# Altium schematic symbol library Schlib.SchLib: 725 symbols (part 2 of 6) (continued)
## BAT54LP-7
designator D?  (value not drawn)
BAT54LP Series 30 V 600 mA Surface Mount Schottky Barrier Diode - DFN1006-2; Manufacturer: Diodes; Manufacturer Part Number: BAT54LP-7; Reverse Voltage: 30V; Supplier: Future Electronics; Supplier Part Number: 2694545; RoHS: Yes; Category: Schottky Diodes; Stock: 663000; Pricing: 3000=0.0541, 9000=0.0521, 15000=0.0512, 45000=0.0492, 75000=0.0476 (USD); ComponentLink1URL: https://datasheet.ciiva.com/16210/ds30504-16210561.pdf?src-supplier=Future+Electronics; ComponentLink1Description: https://datasheet.ciiva.com/16210/ds30504-16210561.pdf?src-supplier=Future+Electronics; ComponentLink2URL: https://datasheet.ciiva.com/4715/ds30504-85267-4715512.pdf?src-supplier=Mouser; ComponentLink2Description: https://datasheet.ciiva.com/4715/ds30504-85267-4715512.pdf?src-supplier=Mouser; ComponentLink3URL: https://datasheet.ciiva.com/15144/getdatasheetpartid-39647-15144085.pdf?src-supplier=Verical; ComponentLink3Description: https://datasheet.ciiva.com/15144/getdatasheetpartid-39647-15144085.pdf?src-supplier=Verical; ComponentLink4URL: https://datasheet.ciiva.com/913/ds30504-913080.pdf?src-supplier=Digikey; ComponentLink4Description: https://datasheet.ciiva.com/913/ds30504-913080.pdf?src-supplier=Digikey; ComponentLink5URL: https://datasheet.ciiva.com/913/ds30504-913081.pdf?src-supplier=Digikey; ComponentLink5Description: https://datasheet.ciiva.com/913/ds30504-913081.pdf?src-supplier=Digikey; ComponentLink6URL: https://datasheet.ciiva.com/913/ds30504-913082.pdf?src-supplier=Digikey; ComponentLink6Description: https://datasheet.ciiva.com/913/ds30504-913082.pdf?src-supplier=Digikey; ComponentLink7URL: https://datasheet.ciiva.com/1180/ds30504-1180298.pdf?src-supplier=Element14; ComponentLink7Description: https://datasheet.ciiva.com/1180/ds30504-1180298.pdf?src-supplier=Element14; ComponentLink8URL: https://datasheet.ciiva.com/8300/ds30504-8300695.pdf?src-supplier=Avnet; ComponentLink8Description: https://datasheet.ciiva.com/8300/ds30504-8300695.pdf?src-supplier=Avnet; ComponentLink9URL: https://datasheet.ciiva.com/8303/ds30504-8303286.pdf?src-supplier=Avnet; ComponentLink9Description: https://datasheet.ciiva.com/8303/ds30504-8303286.pdf?src-supplier=Avnet; ComponentLink10URL: https://datasheet.ciiva.com/22695/1915672-22695255.pdf?src-supplier=Element14; ComponentLink10Description: https://datasheet.ciiva.com/22695/1915672-22695255.pdf?src-supplier=Element14
footprint DFN1006
pins: 1 C, 2 A

## BC807-40W-7
designator Q?  (value not drawn)
BC807 Series PNP 200 mW 45 V 500 mA SMT Small Signal Transistor - SOT-323; Manufacturer: Diodes; Manufacturer Part Number: BC807-40W-7; Collector Emitter Voltage (VCEO): 45V; Max Power Dissipation: 200mW; Number of Elements: 1; Frequency: 100MHz; hFE Min: 250; Max Collector Current: 500mA; Collector Emitter Breakdown Voltage: -45V; Emitter Base Voltage (VEBO): 5V; Collector Emitter Saturation Voltage: -700mV; Element Configuration: Single; Collector-emitter Voltage-Max: 700mV; Supplier: Digi-Key; Supplier Part Number: BC807-40WDICT-ND; RoHS: Yes; Category: BJTs; Stock: 57551; Pricing: 1=0.29000, 10=0.23900, 100=0.12690, 500=0.08348, 1000=0.05676 (USD); Mounting Technology: Surface Mount; Case/Package: SOT-323; Pins: 3; Weight: 0.000212oz; Contact Plating: Tin,Matte; Min Operating Temperature: -65°C; Max Operating Temperature: 150°C; Package Quantity: 3000; Packaging: Tape and Reel; Polarity: PNP; Series: -; Transition Frequency: 100MHz; Max Breakdown Voltage: 45V; Collector Base Voltage (VCBO): 45V; Power Dissipation: 200mW; Gain Bandwidth Product: 100MHz; Clock Frequency: 100MHz; Length: 2.2mm; Width: 1.35mm; Height: 1mm; Radiation Hardening: No; Reach SVHC Compliant: Yes; Lead Free: Lead Free; RoHS Compliant: Yes; ComponentLink1URL: https://datasheet.ciiva.com/11207/ds30577-11207878.pdf?src-supplier=Avnet; ComponentLink1Description: https://datasheet.ciiva.com/11207/ds30577-11207878.pdf?src-supplier=Avnet; ComponentLink2URL: https://datasheet.ciiva.com/4723/ds30577-4723655.pdf?src-supplier=Mouser; ComponentLink2Description: https://datasheet.ciiva.com/4723/ds30577-4723655.pdf?src-supplier=Mouser; ComponentLink3URL: https://datasheet.ciiva.com/11197/ds30577-11197854.pdf?src-supplier=Avnet; ComponentLink3Description: https://datasheet.ciiva.com/11197/ds30577-11197854.pdf?src-supplier=Avnet; ComponentLink4URL: https://datasheet.ciiva.com/1195/ds30577-1195702.pdf?src-supplier=Element14; ComponentLink4Description: https://datasheet.ciiva.com/1195/ds30577-1195702.pdf?src-supplier=Element14
footprint SOT-323, SC-70
pins: 1 B, 2 E, 3 C

## BC817-40WT1G
designator Q?  (value not drawn)
45 V, 0.5 A, General Purpose NPN Transistor SS SC70 GP XSTR NPN 45V; Manufacturer: ON Semiconductor; Manufacturer Part Number: BC817-40WT1G; Max Collector Current: 500mA; Collector Emitter Voltage (VCEO): 700mV; Max Power Dissipation: 460mW; Transition Frequency: 100MHz; Collector Base Voltage (VCBO): 50V; Emitter Base Voltage (VEBO): 5V; Supplier: Digi-Key; Supplier Part Number: BC817-40WT1GOSCT-ND; RoHS: Yes; Category: BJTs; Stock: 106353; Pricing: 1=0.21000, 10=0.17300, 100=0.09180, 500=0.06042, 1000=0.04109 (USD); Mounting Technology: Surface Mount; Contact Plating: Tin; Min Operating Temperature: -55°C; Max Operating Temperature: 150°C; Packaging: Tape and Reel; Collector Emitter Breakdown Voltage: 45V; Lead Free: Lead Free; RoHS Compliant: Yes; ComponentLink1URL: http://www.farnell.com/datasheets/2578322.pdf?src-supplier=Farnell; ComponentLink1Description: http://www.farnell.com/datasheets/2578322.pdf?src-supplier=Farnell; ComponentLink2URL: http://www.onsemi.com/pub/Collateral/BC817-40W-D.PDF?src-supplier=Digi-Key; ComponentLink2Description: http://www.onsemi.com/pub/Collateral/BC817-40W-D.PDF?src-supplier=Digi-Key; ComponentLink3URL: http://www.farnell.com/datasheets/2578322.pdf?src-supplier=Newark; ComponentLink3Description: http://www.farnell.com/datasheets/2578322.pdf?src-supplier=Newark; ComponentLink4URL: http://www.onsemi.com/pub/Collateral/BC817-40W-D.PDF?src-supplier=Avnet; ComponentLink4Description: http://www.onsemi.com/pub/Collateral/BC817-40W-D.PDF?src-supplier=Avnet
footprint SOT-323, SC-70
pins: 1 B, 2 E, 3 C

## BD11600NUX-E2
designator U?  (value not drawn)
DP Type (USB 1ch), VSON010X3020 , RoHS; Manufacturer: Rohm; Manufacturer Part Number: BD11600NUX-E2; Supplier: Rs; Supplier Part Number: 1288866; RoHS: Yes; Category: USB Interface ICs; Stock: 370; Pricing: 10=0.78, 50=0.742, 100=0.592, 500=0.526, 1000=0.511 (GBP); ComponentLink1URL: https://datasheet.ciiva.com/29646/bd11600nux-e-29646416.pdf?src-supplier=Digi-Key; ComponentLink1Description: https://datasheet.ciiva.com/29646/bd11600nux-e-29646416.pdf?src-supplier=Digi-Key
footprint BD11600NUX-E2
pins: 1 1D+, 2 1D-, 3 2D+, 4 2D-, 5 GND, 6 OE, 7 D-, 8 D+, 9 S, 10 VCC, 11 EP

## BLM18AG601SN1D
designator FB?  (value not drawn)
Ferrite Beads Multi-Layer 600Ohm 25% 100MHz 500mA 380mOhm DCR 0603 Automotive Paper T/R; Manufacturer: Murata; Manufacturer Part Number: BLM18AG601SN1D; Material: Steel,Ferrite; Impedance: 600R; Number of Lines: 1; DC Resistance (DCR): 380mR; Shielding: Unshielded; Supplier: Rs; Supplier Part Number: 7241299; RoHS: Yes; Category: Ferrite Beads and Chips; Stock: 6825; Pricing: 25=0.048, 500=0.041, 1000=0.036, 2500=0.032, 5000=0.029 (GBP); Case/Package: 0603; Pins: 2; Core Material: Ferrite; Case Code (Metric): 1608; Case Code (Imperial): 0603; Weight: 7.1E-05oz; Min Operating Temperature: -55°C; Max Operating Temperature: 125°C; Tolerance: 25%; Package Quantity: 1; Max Current Rating: 500mA; Packaging: Tape and Reel; Current Rating: 500mA; Termination: SMD/SMT; Max DC Current: 500mA; Test Frequency: 100MHz; DC Current: 500mA; Frequency: 100MHz; Number of Circuits: 1; Series: BLM18A; DC Resistance-Max: 380mR; RMS Current (Irms): 500mA; ESR: 380mR; Length: 1.6mm; Width: 0.8mm; Height: 0.8mm; Depth: 0.8mm; Radiation Hardening: No; Reach SVHC Compliant: No; Military Standard: Not; Lead Free: Lead Free; RoHS Compliant: Yes; ComponentLink1URL: https://datasheet.ciiva.com/19460/1844766-19460213.pdf?src-supplier=Jameco; ComponentLink1Description: https://datasheet.ciiva.com/19460/1844766-19460213.pdf?src-supplier=Jameco; ComponentLink2URL: https://datasheet.ciiva.com/41449/001172228-da-01-en-drossel-0603-600r-1-6x0-8mm-4000st-41449517.pdf?src-supplier=Conrad; ComponentLink2Description: https://datasheet.ciiva.com/41449/001172228-da-01-en-drossel-0603-600r-1-6x0-8mm-4000st-41449517.pdf?src-supplier=Conrad; ComponentLink3URL: https://datasheet.ciiva.com/29347/442309-da-01-en-chip-drossel-0603-600r-500ma-1-6x0-8mm-29347900.pdf?src-supplier=Conrad; ComponentLink3Description: https://datasheet.ciiva.com/29347/442309-da-01-en-chip-drossel-0603-600r-500ma-1-6x0-8mm-29347900.pdf?src-supplier=Conrad; ComponentLink4URL: https://datasheet.ciiva.com/1466/1756147-1466934.pdf?src-supplier=Element14; ComponentLink4Description: https://datasheet.ciiva.com/1466/1756147-1466934.pdf?src-supplier=Element14; ComponentLink5URL: https://datasheet.ciiva.com/1466/1756147-1466933.pdf?src-supplier=Element14; ComponentLink5Description: https://datasheet.ciiva.com/1466/1756147-1466933.pdf?src-supplier=Element14; ComponentLink6URL: https://datasheet.ciiva.com/1012/l0110s0100blm18a-1012018.pdf?src-supplier=Digi-Key; ComponentLink6Description: https://datasheet.ciiva.com/1012/l0110s0100blm18a-1012018.pdf?src-supplier=Digi-Key; ComponentLink7URL: https://datasheet.ciiva.com/1012/l0110s0100blm18a-1012017.pdf?src-supplier=Digi-Key; ComponentLink7Description: https://datasheet.ciiva.com/1012/l0110s0100blm18a-1012017.pdf?src-supplier=Digi-Key; ComponentLink8URL: https://datasheet.ciiva.com/1012/l0110s0100blm18a-1012019.pdf?src-supplier=Digi-Key; ComponentLink8Description: https://datasheet.ciiva.com/1012/l0110s0100blm18a-1012019.pdf?src-supplier=Digi-Key; ComponentLink9URL: https://datasheet.ciiva.com/16210/l0110s0100blm18a-16210006.pdf?src-supplier=Future+Electronics; ComponentLink9Description: https://datasheet.ciiva.com/16210/l0110s0100blm18a-16210006.pdf?src-supplier=Future+Electronics
footprint L 0603
pins: 1, 2

## BM02B-GHS-TBT(LF)(SN)
designator J?  (value not drawn)
2 Position Single Row 1.25 mm Pitch 50 V 1 A Header Connector; Manufacturer: JST; Manufacturer Part Number: BM02B-GHS-TBT(LF)(SN); Number of Positions: 2; Voltage Rating: 50V; Current Rating: 1A; Pitch: 1.25mm; Wire/Cable Gauge: 26AWG; Supplier: Rs; Supplier Part Number: 7521762; RoHS: Yes; Category: Headers and Wire Housings; Stock: 4; Pricing: 5=0.584, 125=0.33, 500=0.294, 2500=0.274, 5000=0.262 (GBP); Contact Plating: Tin; Contact Material: Bronze; Housing Color: Natural; Housing Material: Nylon; Min Operating Temperature: -25°C; Max Operating Temperature: 85°C; Number of Rows: 1; Termination: SMD/SMT; Packaging: Cut Tape; Series: GH; Voltage Rating (AC): 50V; Number of Contacts: 2; Orientation: Straight; Lead Free: Lead Free; Reach SVHC Compliant: No; ComponentLink1URL: https://datasheet.ciiva.com/25618/0900766b810cef17-25618268.pdf?src-supplier=Rs; ComponentLink1Description: https://datasheet.ciiva.com/25618/0900766b810cef17-25618268.pdf?src-supplier=Rs; ComponentLink2URL: https://datasheet.ciiva.com/16371/bm02b-ghs-tbt-lf-sn-16371589.pdf?src-supplier=Future+Electronics; ComponentLink2Description: https://datasheet.ciiva.com/16371/bm02b-ghs-tbt-lf-sn-16371589.pdf?src-supplier=Future+Electronics; ComponentLink3URL: https://datasheet.ciiva.com/8052/5438-8052076.pdf?src-supplier=Element14; ComponentLink3Description: https://datasheet.ciiva.com/8052/5438-8052076.pdf?src-supplier=Element14; ComponentLink4URL: https://datasheet.ciiva.com/5721/5438-5721837.pdf?src-supplier=Farnell; ComponentLink4Description: https://datasheet.ciiva.com/5721/5438-5721837.pdf?src-supplier=Farnell
footprint BM02B-GHS-TBT(LF)(SN)
pins: 1, 2, 3 SH, 4 SH

## BM02B-SRSS-TBT(LF)(SN)
designator J?  (value not drawn)
Conn Shrouded Header HDR 2 POS Solder ST SMD Reel | CONN HEADER SMD 2POS 1MM; Manufacturer: JST; Manufacturer Part Number: BM02B-SRSS-TBT(LF)(SN); Contact Resistance: 20mR; Max Current Rating: 1A; Number of Positions: 2; Max Voltage Rating (AC): 50V; Current Rating: 700mA; Pitch: 0.039inch; Mated Stacking Heights: 4.9mm; Supplier: Future Electronics; Supplier Part Number: 1671007; RoHS: Yes; Category: Headers and Wire Housings; Stock: 4500; Pricing: 1500=0.32, 3000=0.31, 4500=0.305, 6000=0.305, 7500=0.295 (USD); Mounting Technology: Surface Mount; Color: Natural; Contact Material: Copper Alloy; Contact Plating: Tin; Housing Color: Natural; Housing Material: Polyamide; Contact Shape: Square; Contact Finish - Mating: TIN; Insulation Material: Nylon; Insulation Color: Natural; Min Operating Temperature: -25°C; Max Operating Temperature: 85°C; Package Quantity: 1500; Number of Rows: 1; Packaging: Tape and Reel; Termination: Solder; Max Voltage Rating (DC): 50V; Orientation: Straight; Connector Type: Header; Series: SR; Contact Type: Male Pin; Fastening Type: Pull; Voltage Rating: 50V; Length: 4mm; Depth: 3.6mm; Lead Free: Lead Free; Flammability Rating: UL94 V-0; ComponentLink1URL: https://datasheet.ciiva.com/26924/getdatasheetpartid-707004-26924042.pdf?src-supplier=Verical; ComponentLink1Description: https://datasheet.ciiva.com/26924/getdatasheetpartid-707004-26924042.pdf?src-supplier=Verical; ComponentLink2URL: https://datasheet.ciiva.com/26894/getdatasheetpartid-714049-26894825.pdf?src-supplier=Verical; ComponentLink2Description: https://datasheet.ciiva.com/26894/getdatasheetpartid-714049-26894825.pdf?src-supplier=Verical; ComponentLink3URL: https://datasheet.ciiva.com/726/esr-726594.pdf?src-supplier=Digikey; ComponentLink3Description: https://datasheet.ciiva.com/726/esr-726594.pdf?src-supplier=Digikey; ComponentLink4URL: https://datasheet.ciiva.com/16379/esr-16379596.pdf?src-supplier=Future+Electronics; ComponentLink4Description: https://datasheet.ciiva.com/16379/esr-16379596.pdf?src-supplier=Future+Electronics
footprint BM02B-SRSS-TBT(LF)(SN)
pins: 1, 2, 3 SH, 4 SH

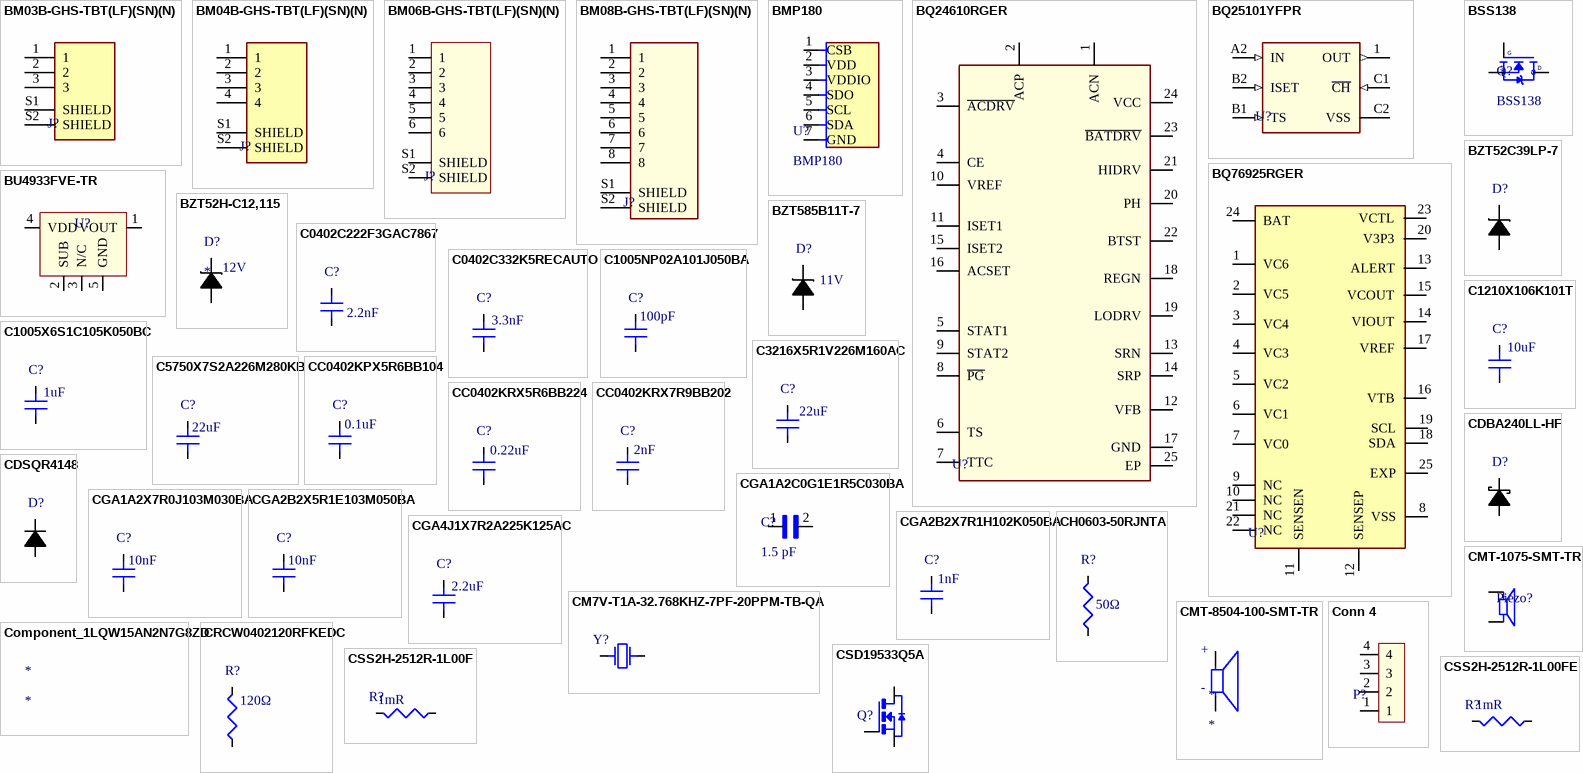
[diagram p6: symbols BM03B-GHS-TBT(LF)(SN)(N) to CSS2H-2512R-1L00FE]

## BM03B-GHS-TBT(LF)(SN)(N)
designator J?  (value not drawn)
Connector Header, GH Series, 3 Position, 1.25mm, 50V, Surface Mount, Locking Ramp, Natural; Manufacturer: JST; Manufacturer Part Number: BM03B-GHS-TBT(LF)(SN)(N); Current Rating: 1A; Number of Contacts: 3NUMBER; Supplier: Arrow Electronics; Supplier Part Number: BM03B-GHS-TBT (LF)(SN)(N); RoHS: Yes; Category: Headers and Wire Housings; Stock: 5000; Pricing: 2500=0.352, 5000=0.3351, 10000=0.3244, 20000=0.3146, 25000=0.3041, 50000=0.2948 (USD); Orientation: 5495OrientationType; Height: 4.05mm; Lead Free: 5697LeadFree; ComponentLink1URL: https://datasheet.ciiva.com/730/egh-730628.pdf?src-supplier=Digikey; ComponentLink1Description: https://datasheet.ciiva.com/730/egh-730628.pdf?src-supplier=Digikey
footprint BM03B-GHS-TBT(LF)(SN)
pins: 1, 2, 3, S1 SHIELD, S2 SHIELD

## BM04B-GHS-TBT(LF)(SN)(N)
designator J?  (value not drawn)
Conn Shrouded Header HDR 4 POS 1.25mm Solder ST Top Entry SMD T/R; Manufacturer: JST; Manufacturer Part Number: BM04B-GHS-TBT(LF)(SN)(N); Supplier: Digi-Key; Supplier Part Number: 455-1580-1-ND; RoHS: Yes; Category: Headers and Wire Housings; Stock: 4992; Pricing: 1=0.50000, 10=0.42400, 100=0.32960, 500=0.28252, 1000=0.23544 (USD); ComponentLink1URL: http://www.jst-mfg.com/product/pdf/eng/eGH.pdf?src-supplier=Digi-Key; ComponentLink1Description: http://www.jst-mfg.com/product/pdf/eng/eGH.pdf?src-supplier=Digi-Key; ComponentLink2URL: http://www.jst-mfg.com/product/pdf/eng/eGH.pdf?src-supplier=Component+Distributors+Inc.; ComponentLink2Description: http://www.jst-mfg.com/product/pdf/eng/eGH.pdf?src-supplier=Component+Distributors+Inc.
footprint BM04B-GHS-TBT(LF)(SN)(N)
pins: 1, 2, 3, 4, S1 SHIELD, S2 SHIELD

## BM06B-GHS-TBT(LF)(SN)(N)
designator J?  (value not drawn)
Conn Shrouded Header (4 Sides) HDR 6 POS 1.25mm Solder ST Top Entry SMD T/R; Manufacturer: JST; Manufacturer Part Number: BM06B-GHS-TBT(LF)(SN)(N); Number of Positions: 6; Voltage Rating: 50V; Pitch: 0.049inch; Mated Stacking Heights: 7.3mm; Supplier: Digi-Key; Supplier Part Number: 455-1582-6-ND; RoHS: Yes; Category: Connectors; Pricing: 1=0.55, 10=0.482, 100=0.397, 500=0.34518, 1000=0.28477 (USD); Mounting Technology: Surface Mount; Color: Natural; Contact Plating: Tin; Contact Material: Bronze; Contact Shape: Rectangular; Contact Finish - Mating: TIN; Insulation Material: Nylon; Insulation Color: Natural; Min Operating Temperature: -25°C; Max Operating Temperature: 85°C; Number of Rows: 1; Fastening Type: Ramp; Packaging: Cut Tape; Termination: Solder; Connector Type: Header; Series: GH; Contact Type: Outer Shroud Contact; Lead Free: Lead Free; Flammability Rating: UL94 V-0; ComponentLink1URL: https://datasheet.ciiva.com/712/egh-712475.pdf?src-supplier=Digi-Key; ComponentLink1Description: https://datasheet.ciiva.com/712/egh-712475.pdf?src-supplier=Digi-Key; ComponentLink2URL: https://datasheet.ciiva.com/712/egh-712476.pdf?src-supplier=Digi-Key; ComponentLink2Description: https://datasheet.ciiva.com/712/egh-712476.pdf?src-supplier=Digi-Key; ComponentLink3URL: https://datasheet.ciiva.com/730/egh-730626.pdf?src-supplier=Digi-Key; ComponentLink3Description: https://datasheet.ciiva.com/730/egh-730626.pdf?src-supplier=Digi-Key
footprint BM06B-GHS-TBT(LF)(SN)(N)
pins: 1, 2, 3, 4, 5, 6, S1 SHIELD, S2 SHIELD

## BM08B-GHS-TBT(LF)(SN)(N)
designator J?  (value not drawn)
Connector Header, GH Series, 8 Position, 1.25mm, 50V, Surface Mount, Locking Ramp, Natural; Manufacturer: JST; Manufacturer Part Number: BM08B-GHS-TBT(LF)(SN)(N); Supplier: Digi-Key; Supplier Part Number: 455-1584-6-ND; RoHS: Yes; Category: Headers and Wire Housings; Pricing: 1=0.59000, 10=0.51200, 100=0.42200, 500=0.36700, 1000=0.30277 (USD); ComponentLink1URL: http://www.jst-mfg.com/product/pdf/eng/eGH.pdf?src-supplier=Digi-Key; ComponentLink1Description: http://www.jst-mfg.com/product/pdf/eng/eGH.pdf?src-supplier=Digi-Key
footprint BM08B-GHS-TBT(LF)(SN)(N)
pins: 1, 2, 3, 4, 5, 6, 7, 8, S1 SHIELD, S2 SHIELD

## BMP180
designator U?
Pressure Sensor 4.35PSI ~ 15.95PSI (30kPa ~ 110kPa) Absolute - 16 ~ 19 b 7-VLGA; Manufacturer Part Number: BMP180
footprint BMP180
pins: 1 CSB (io), 2 VDD (io), 3 VDDIO (io), 4 SDO (io), 5 SCL (io), 6 SDA (io), 7 GND (io)

## BQ24610RGER
designator U?  (value not drawn)
Charger IC Lithium-Ion/Polymer 24-VQFN (4x4); Manufacturer: Texas Instruments; Manufacturer Part Number: BQ24610RGER; Output Current: 10A; Max Supply Voltage: 28V; Min Supply Voltage: 5V; Switching Frequency: 600kHz; Number of Cells: 123456; Fault Protection: Over Current,Over Voltage,Over Temperature,Short Circuit; Battery Pack Voltage: 2.1V; Supplier: Mouser; Supplier Part Number: 595-BQ24610RGER; RoHS: Yes; Category: Battery Management; Stock: 2142; Pricing: 1=4.44, 10=3.99, 50=3.99, 100=3.27, 1000=2.34, 10000=2.27 (USD); Case/Package: VQFN; Pins: 24; Contact Plating: Gold; Min Operating Temperature: -40°C; Max Operating Temperature: 125°C; Packaging: Tape and Reel; Package Quantity: 3000; Min Input Voltage: 5V; Series: -; Max Charge Current: 10A; Lead Free: Lead Free; RoHS Compliant: Yes; ComponentLink1URL: https://datasheet.ciiva.com/1934/bq24610-1934921.pdf?src-supplier=Digikey; ComponentLink1Description: https://datasheet.ciiva.com/1934/bq24610-1934921.pdf?src-supplier=Digikey; ComponentLink2URL: https://datasheet.ciiva.com/1934/bq24610-1934920.pdf?src-supplier=Digikey; ComponentLink2Description: https://datasheet.ciiva.com/1934/bq24610-1934920.pdf?src-supplier=Digikey; ComponentLink3URL: https://datasheet.ciiva.com/1934/bq24610-1934922.pdf?src-supplier=Digikey; ComponentLink3Description: https://datasheet.ciiva.com/1934/bq24610-1934922.pdf?src-supplier=Digikey
footprint BQ24610RGER
pins: 1 ACN, 2 ACP, 3 ~{ACDRV}, 4 CE, 5 STAT1, 6 TS, 7 TTC, 8 ~{PG}, 9 STAT2, 10 VREF, 11 ISET1, 12 VFB, 13 SRN, 14 SRP, 15 ISET2, 16 ACSET, 17 GND, 18 REGN, 19 LODRV, 20 PH, 21 HIDRV, 22 BTST, 23 ~{BATDRV}, 24 VCC, 25 EP

## BQ25101YFPR
designator U?  (value not drawn)
Battery Charger Li-Ion/Li-Pol 250mA 4.2V 6-Pin DSBGA T/R; Manufacturer: Texas Instruments; Manufacturer Part Number: BQ25101YFPR; Supplier: Mouser; Supplier Part Number: 595-BQ25101YFPR; RoHS: Yes; Category: Battery Management; Stock: 4528; Pricing: 1=1.7, 10=1.48, 50=1.48, 100=1.22, 1000=0.825, 10000=0.728 (USD); ComponentLink1URL: http://www.ti.com/lit/ds/symlink/bq25100h.pdf?src-supplier=Digi-Key; ComponentLink1Description: http://www.ti.com/lit/ds/symlink/bq25100h.pdf?src-supplier=Digi-Key; ComponentLink2URL: http://www.ti.com/lit/gpn/bq25101?src-supplier=Mouser; ComponentLink2Description: http://www.ti.com/lit/gpn/bq25101?src-supplier=Mouser; ComponentLink3URL: http://www.ti.com/general/docs/lit/getliterature.tsp?genericPartNumber=BQ25101H&&fileType=pdf&src-supplier=Avnet; ComponentLink3Description: http://www.ti.com/general/docs/lit/getliterature.tsp?genericPartNumber=BQ25101H&&fileType=pdf&src-supplier=Avnet
footprint BQ25101YFPR
pins: 1 OUT (out), A2 IN (in), B1 TS (in), B2 ISET (in), C1 ~{CH} (in), C2 VSS (power)

## BQ76925RGER
designator U?  (value not drawn)
BQ76925 Analog Front End For 3 T; Manufacturer: Texas Instruments; Manufacturer Part Number: BQ76925RGER; Min Supply Voltage: 4.2V; Max Supply Voltage: 26.4V; Interface: I2C; Operating Supply Current: 48uA; Fault Protection: Over Current,Over Temperature,Over/Under Voltage; Supplier: Mouser; Supplier Part Number: 595-BQ76925RGER; RoHS: Yes; Category: Battery Management; Stock: 2924; Pricing: 1=2.15, 10=1.82, 50=1.82, 100=1.56, 1000=1.06, 10000=0.935 (USD); Case/Package: VQFN; Pins: 24; Contact Plating: Gold; Min Operating Temperature: -25°C; Max Operating Temperature: 85°C; Packaging: Tape and Reel; Package Quantity: 3000; Series: -; Lead Free: Lead Free; RoHS Compliant: Yes; ComponentLink1URL: https://datasheet.ciiva.com/29610/bq76925-29610064.pdf?src-supplier=Digikey; ComponentLink1Description: https://datasheet.ciiva.com/29610/bq76925-29610064.pdf?src-supplier=Digikey; ComponentLink2URL: https://datasheet.ciiva.com/3230/bq76925-3230797.pdf?src-supplier=Avnet; ComponentLink2Description: https://datasheet.ciiva.com/3230/bq76925-3230797.pdf?src-supplier=Avnet
footprint BQ76925RGER
pins: 1 VC6, 2 VC5, 3 VC4, 4 VC3, 5 VC2, 6 VC1, 7 VC0, 8 VSS, 9 NC, 10 NC, 11 SENSEN, 12 SENSEP, 13 ALERT, 14 VIOUT, 15 VCOUT, 16 VTB, 17 VREF, 18 SDA, 19 SCL, 20 V3P3, 21 NC, 22 NC, 23 VCTL, 24 BAT, 25 EXP

## BSS138
designator Q?
N-Channel 50 V 220mA (Tj) 430mW Surface Mount SOT-23; Manufacturer Part Number: BSS138
footprint BSS138
pins: 1 G, 2 S, 3 D

## BU4933FVE-TR
designator U?  (value not drawn)
IC VOLT DETECTOR STD 5-VSOF; Manufacturer: Rohm; Manufacturer Part Number: BU4933FVE-TR; Max Supply Current: 1.4uA; Min Supply Voltage: 700mV; Max Supply Voltage: 7V; Max Power Dissipation: 210mW; Threshold Voltage: 3.3V; Number of Monitored Inputs: 1; Quiescent Current: 450nA; Accuracy: 1%; Operating Supply Current: 550nA; Overvoltage Threshold: 3.333V; Undervoltage Threshold: 3.267V; Watchdog Timer: No; Supplier 1: Digi-Key; RoHS: Yes; Category: Voltage Supervisors; Stock 1: 1729; Pricing 1: 1=0.57000, 10=0.49700, 25=0.46720, 100=0.35410, 250=0.30140, 500=0.28634, 1000=0.21852 (USD); Mount: Surface Mount; Number of Pins: 5; Min Operating Temperature: -40°C; Max Operating Temperature: 125°C; Type: Voltage Detector; Packaging: Tape and Reel; Package Quantity: 3000; Min Reset Threshold Voltage: 3.267V; Max Reset Threshold Voltage: 3.333V; ComponentLink1URL: https://datasheet.ciiva.com/8133/bu48xxg-e-8133688.pdf?src-supplier=Avnet; ComponentLink1Description: https://datasheet.ciiva.com/8133/bu48xxg-e-8133688.pdf?src-supplier=Avnet; Supplier Part Number 1: BU4933FVE-CT-ND
footprint BU4933FVE-TR (SOTFL, 5-Leads, Body 1.60x1.60mm, Pitch 0.50mm, IPC Medium Density)
pins: 1 VOUT, 2 SUB, 3 N/C, 4 VDD, 5 GND

## BZT52C39LP-7
designator D?  (value not drawn)
Diode Zener Single 39V 5% 250mW 2-Pin DFN T/R; Manufacturer: Diodes Zetex; Manufacturer Part Number: BZT52C39LP-7; Max Reverse Leakage Current: 100nA; Impedance: 130R; Voltage Tolerance: 5.13%; Test Current: 2mA; Forward Voltage: 900mV; ESD Protection: No; Supplier: Digikey; Supplier Part Number: BZT52C39LPDICT-ND; RoHS: Yes; Category: Zener Diodes; Stock: 2852; Pricing: 1=0.46, 10=0.319, 100=0.1612, 500=0.1315, 1000=0.09757 (USD); Mounting Technology: Surface Mount; Case/Package: DFN; Pins: 2; Weight: 3.5E-05oz; Contact Plating: Gold; Min Operating Temperature: -65°C; Max Operating Temperature: 150°C; Max Power Dissipation: 250mW; Zener Voltage: 39V; Package Quantity: 3000; Packaging: Tape and Reel; Tolerance: 5%; Power Dissipation: 250mW; Termination: SMD/SMT; Zener Current: 100nA; Max Reverse Current: 100nA; Power Rating: 250mW; Series: -; Length: 1mm; Width: 0.6mm; Height: 0.5mm; Reach SVHC Compliant: Yes; RoHS Compliant: Yes; ComponentLink1URL: https://datasheet.ciiva.com/14846/ds30506-14846830.pdf?src-supplier=Arrow+Electronics; ComponentLink1Description: https://datasheet.ciiva.com/14846/ds30506-14846830.pdf?src-supplier=Arrow+Electronics; ComponentLink2URL: https://datasheet.ciiva.com/10642/ds30506-10642854.pdf?src-supplier=Avnet; ComponentLink2Description: https://datasheet.ciiva.com/10642/ds30506-10642854.pdf?src-supplier=Avnet
footprint DFN1006
pins: 1 C, 2 A

## BZT52H-C12,115
designator D?  Voltage - Zener: 12V
DIODE ZENER 12V  SOD123F; Manufacturer: Nexperia; Manufacturer Part Number: BZT52H-C12,115; Supplier: Future Electronics; Supplier Part Number: 9011163; RoHS: Yes; Category: Zener Diodes; Stock: 33000; Pricing: 3000=0.0205, 12000=0.0196, 30000=0.0191, 75000=0.0185, 120000=0.0177 (USD); RoHS Compliant: Yes; ComponentLink1URL: http://www.farnell.com/datasheets/954062.pdf?src-supplier=Farnell; ComponentLink1Description: http://www.farnell.com/datasheets/954062.pdf?src-supplier=Farnell; ComponentLink2URL: https://assets.nexperia.com/documents/data-sheet/BZT52H_SER.pdf?src-supplier=Digikey; ComponentLink2Description: https://assets.nexperia.com/documents/data-sheet/BZT52H_SER.pdf?src-supplier=Digikey; ComponentLink3URL: https://datasheet.octopart.com/BZT52H-C12%2C115-Nexperia-datasheet-10077450.pdf?src-supplier=Newark; ComponentLink3Description: https://datasheet.octopart.com/BZT52H-C12%2C115-Nexperia-datasheet-10077450.pdf?src-supplier=Newark
footprint SOD-123F
pins: 1 C, 2 A

## BZT585B11T-7
designator D?  Voltage - Zener: 11V  (hidden comment: *)
Diode Zener Single 11V 2% 350mW Automotive 2-Pin SOD-523 T/R; Manufacturer: Diodes; Manufacturer Part Number: BZT585B11T-7; Supplier: Future Electronics; Supplier Part Number: 9137161; RoHS: Yes; Category: Zener Diodes; Stock: 12000; Pricing: 3000=0.0213, 9000=0.0205, 15000=0.0202, 60000=0.0193, 90000=0.0187 (USD); ComponentLink1URL: http://www.mouser.com/ds/2/115/BZT585BxVxT-318149.pdf?src-supplier=Mouser; ComponentLink1Description: http://www.mouser.com/ds/2/115/BZT585BxVxT-318149.pdf?src-supplier=Mouser; ComponentLink2URL: https://www.diodes.com/assets/Datasheets/BZT585BxVxT.pdf?src-supplier=Digikey; ComponentLink2Description: https://www.diodes.com/assets/Datasheets/BZT585BxVxT.pdf?src-supplier=Digikey; ComponentLink3URL: http://diodes.com/datasheets/BZT585BxVxT.pdf?src-supplier=Avnet; ComponentLink3Description: http://diodes.com/datasheets/BZT585BxVxT.pdf?src-supplier=Avnet; ComponentLink4URL: https://datasheet.octopart.com/BZT585B11T-7-Diodes-Inc.-datasheet-65606423.pdf?src-supplier=Farnell; ComponentLink4Description: https://datasheet.octopart.com/BZT585B11T-7-Diodes-Inc.-datasheet-65606423.pdf?src-supplier=Farnell
footprint BZT585B11T-7
pins: 1, 2

## C0402C222F3GAC7867
designator C?  value 2.2nF
Cap Ceramic 0.0022uF 25V C0G 1% SMD 0402 Plastic T/R; Manufacturer: KEMET; Manufacturer Part Number: C0402C222F3GAC7867; Temperature Coefficient: 30ppm/°C; Case/Package: 0402; Category: Ceramic Capacitors; China RoHS: Compliant; Dielectric: C0G; Dielectric Material: Ceramic; Height: 500µm; Lead Free: Lead Free; Length: 1mm; Lifecycle Status: Production; Material: Ceramic; Max Operating Temperature: 125°C; Min Operating Temperature: -55°C; Mounting Technology: Surface Mount; Number of Terminals: 2; REACH SVHC: Yes; RoHS: Compliant; Tolerance: 1%; Voltage Rating: 25V; Voltage Rating (DC): 25V; Width: 500µm
footprint C 0402 (1005 Metric) (Chip Capacitor, Body 1.0x0.5mm, IPC High Density)
pins: 1 B, 2 A

## C0402C332K5RECAUTO
designator C?  value 3.3nF  (hidden comment: *)
Multilayer Ceramic Capacitors MLCC - SMD/SMT 50V 3300pF X7R 0402 10% AEC-Q200; Manufacturer: KEMET; Manufacturer Part Number: C0402C332K5RECAUTO; Supplier: Farnell; Supplier Part Number: 3784158; RoHS: Compliant; Category: Ceramic Capacitors; Stock: 3180; Pricing: 10=0.0543, 100=0.0334, 500=0.0277, 1000=0.0219, 2000=0.0186, 10000=0.0153 (EUR); China RoHS: Compliant; Dielectric Material: Ceramic; Height: 500µm; Length: 1mm; Lifecycle Status: Production; Max Operating Temperature: 125°C; Min Operating Temperature: -55°C; Mounting Technology: Surface Mount; Number of Terminals: 2; REACH SVHC: Yes; Voltage Rating (DC): 50V; Width: 500µm; ComponentLink1URL: https://datasheet.octopart.com:443/C0402C332K5RECAUTO-KEMET-datasheet-178568699.pdf?src-supplier=IHS; ComponentLink1Description: https://datasheet.octopart.com:443/C0402C332K5RECAUTO-KEMET-datasheet-178568699.pdf?src-supplier=IHS; ComponentLink2URL: https://datasheet.octopart.com:443/C0402C332K5RECAUTO-KEMET-datasheet-153706760.pdf?src-supplier=element14+APAC; ComponentLink2Description: https://datasheet.octopart.com:443/C0402C332K5RECAUTO-KEMET-datasheet-153706760.pdf?src-supplier=element14+APAC; ComponentLink3URL: https://datasheet.octopart.com:443/C0402C332K5RECAUTO-KEMET-datasheet-170607670.pdf?src-supplier=Newark; ComponentLink3Description: https://datasheet.octopart.com:443/C0402C332K5RECAUTO-KEMET-datasheet-170607670.pdf?src-supplier=Newark
footprint C 0402 (1005 Metric) (Chip Capacitor, Body 1.0x0.5mm, IPC High Density)
pins: 1 B, 2 A

## C1005NP02A101J050BA
designator C?  value 100pF  (hidden comment: *)
Cap Ceramic 100pF 100V C0G 5% SMD 0402 150°C Punched Paper T/R; Manufacturer: TDK; Manufacturer Part Number: C1005NP02A101J050BA; Supplier: Digi-Key; Supplier Part Number: 445-C1005NP02A101J050BACT-ND; RoHS: Yes; Category: Ceramic Capacitors; Stock: 3231; Pricing: 1=0.14000, 10=0.10300, 50=0.05840, 100=0.04830, 500=0.03388, 1000=0.02805, 2500=0.02611, 5000=0.02389 (USD); Mounting Technology: Surface Mount; Case/Package: 0402; Case Code (Imperial): 0402; Case Code (Metric): 1005; Weight: 2.3E-05oz; Min Operating Temperature: -55°C; Max Operating Temperature: 150°C; Packaging: Tape and Reel; Voltage Rating: 100V; Tolerance: 5%; Dielectric: C0G; Termination: SMD/SMT; Voltage Rating (DC): 100V; Package Quantity: 10000; Features: High Temperature; Length: 0.039inch; Width: 0.02inch; Height: 0.5mm; Thickness: 0.022inch; RoHS Compliant: Yes; ComponentLink1URL: http://www.mouser.com/ds/2/400/mlcc_commercial_hightemp_en-348760.pdf?src-supplier=Mouser; ComponentLink1Description: http://www.mouser.com/ds/2/400/mlcc_commercial_hightemp_en-348760.pdf?src-supplier=Mouser; ComponentLink2URL: https://product.tdk.com/en/products/common/pdf/mlcc_partnumber_description.pdf?src-supplier=Digi-Key; ComponentLink2Description: https://product.tdk.com/en/products/common/pdf/mlcc_partnumber_description.pdf?src-supplier=Digi-Key; ComponentLink3URL: http://product.tdk.com/capacitor/mlcc/class/print_detail_pdf.php?lang=en&part_no=C1005NP02A101J050BA&src-supplier=Avnet; ComponentLink3Description: http://product.tdk.com/capacitor/mlcc/class/print_detail_pdf.php?lang=en&part_no=C1005NP02A101J050BA&src-supplier=Avnet
footprint C 0402 (1005 Metric) (Chip Capacitor, Body 1.0x0.5mm, IPC High Density)
pins: 1 B, 2 A

## C1005X6S1C105K050BC
designator C?  value 1uF  (hidden comment: *)
16V 1uF X6S 卤10% 0402 Multilayer Ceramic Capacitors MLCC - SMD/SMT ROHS; Manufacturer: TDK; Manufacturer Part Number: C1005X6S1C105K050BC; Material: 4241ConductorMaterial; Supplier: Farnell; Supplier Part Number: 2525035; RoHS: Yes; Category: Ceramic Capacitors; Stock: 43422; Pricing: 10=0.0477, 100=0.0286, 500=0.0224, 2500=0.0162, 5000=0.0159 (EUR); Dielectric Material: 4241ConductorMaterial; Lead Free: 5697LeadFree; ComponentLink1URL: https://datasheet.ciiva.com/6259/tdkmlcccaprange-6259389.pdf?src-supplier=Digikey; ComponentLink1Description: https://datasheet.ciiva.com/6259/tdkmlcccaprange-6259389.pdf?src-supplier=Digikey; ComponentLink2URL: https://datasheet.ciiva.com/6259/tdkmlcccaprange-6259397.pdf?src-supplier=Digikey; ComponentLink2Description: https://datasheet.ciiva.com/6259/tdkmlcccaprange-6259397.pdf?src-supplier=Digikey
footprint C 0402 (1005 Metric) (Chip Capacitor, Body 1.0x0.5mm, IPC High Density)
pins: 1 B, 2 A

## C1210X106K101T
designator C?  value 10uF  (hidden comment: *)
CAP CER 10UF 100V X7R 1210; Manufacturer: Holystone; Manufacturer Part Number: C1210X106K101T; Supplier: DigiKey; Supplier Part Number: 4587-C1210X106K101TCT-ND; RoHS: No; Stock: 714; Pricing: 1=1.09, 10=0.82, 50=0.7484, 100=0.6131 (USD); Case/Package: 1210
footprint C 1210
pins: 1 B, 2 A

## C3216X5R1V226M160AC
designator C?  value 22uF  (hidden comment: *)